# Altium footprint library RPSLib_Connectors.PcbLib: 85 footprints (part 1 of 6)
Each footprint in its own frame and in the unit in brackets; x right, y up, seen from the top. Pads: shape width x height; smd on the part's side, far side on the other; paste and mask are expansions set on the pad; w line width, h text height; cw(c..) or ccw(c..) is an arc to the next point about the centre after c.
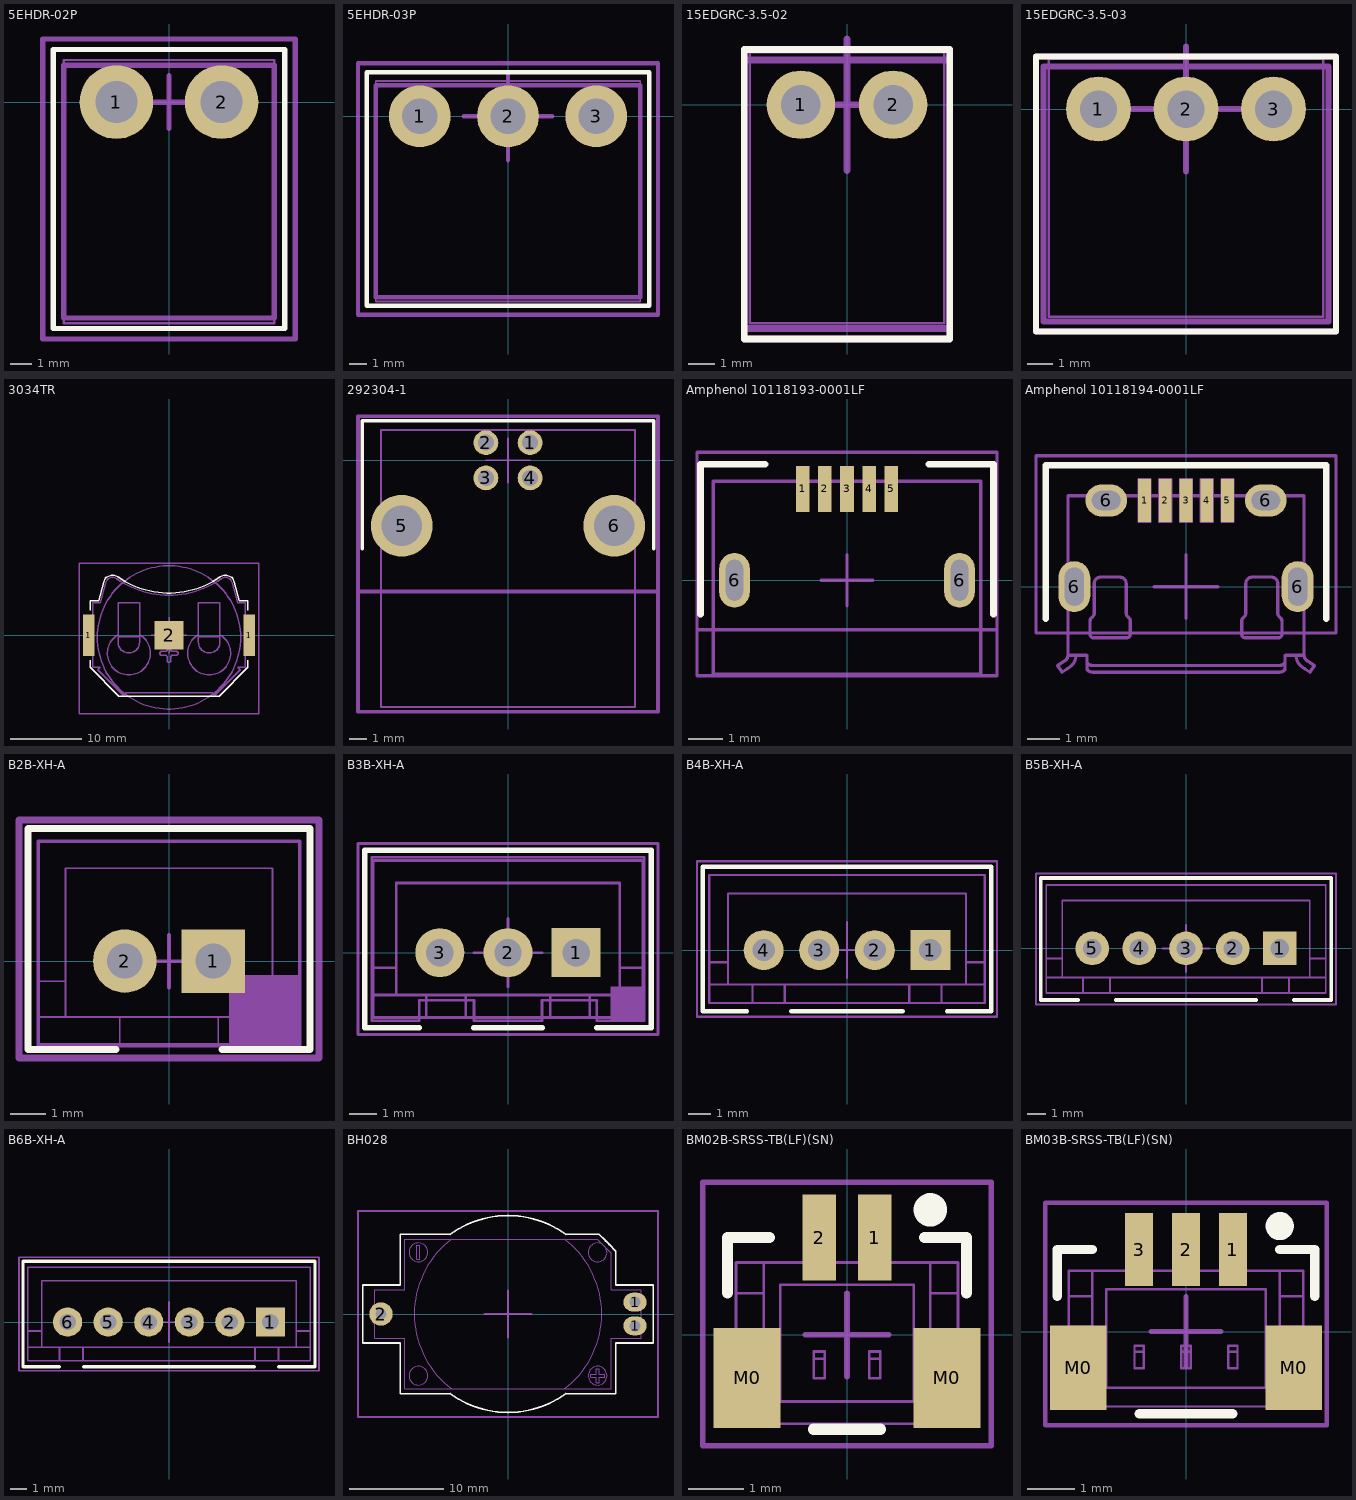
[diagram p0: the footprints below, top view; thin cyan lines are the x and y axes]

## 5EHDR-02P [mm]
pads (2):
  round 3.5 hole 2: 1(-2.5,0) 2(2.5,0)
Top Overlay:
  lines w0.254: -5.5,-10.75 -5.5,2.5 5.5,2.5 5.5,-10.75 -5.5,-10.75
Top Designator:
  lines w0.1: -5,-10.5 -5,2 5,2 5,-10.5 -5,-10.5
  text ".Designator" at -2.868,-0.271 h1.2
Top Courtyard:
  lines w0.254: -1.25,0 1.25,0 ; 0,-1.25 0,1.25 ; -6,-11.25 6,-11.25 6,3 -6,3 -6,-11.25
Top 3D Body:
  lines w0.254: -5,-10.25 5,-10.25 5,1.75 -5,1.75 -5,-10.25
3D body "5EHDR-02P.stp": height 8.47, standoff -4, extent -5,-10.25 5,1.75

## 5EHDR-03P [mm]
pads (3):
  round 3.5 hole 2: 1(-5,0) 2(0,0) 3(5,0)
Top Overlay:
  lines w0.254: -8,-10.75 -8,2.5 8,2.5 8,-10.75 -8,-10.75
Top Designator:
  lines w0.1: -7.5,-10.5 7.5,-10.5 7.5,2 -7.5,2 -7.5,-10.5
  text ".Designator" at -2.868,-0.271 h1.2
Top Courtyard:
  lines w0.254: -2.5,0 2.5,0 ; 0,-2.5 0,2.5 ; -8.5,-11.25 -8.5,3 8.5,3 8.5,-11.25 -8.5,-11.25
Top 3D Body:
  lines w0.254: -7.5,-10.25 -7.5,1.75 7.5,1.75 7.5,-10.25 -7.5,-10.25
20:
  text ".Designator" at -2.253,-0.226 h1
3D body "5EHDR-03P.stp": height 8.47, standoff -4, extent -7.5,-10.25 7.5,1.75

## 15EDGRC-3.5-02 [mm] "Клеммник разъемный угловой 3.5мм 2pin на плату"
height 7
pads (2):
  round 2.6 hole 1.5: 1(-1.75,0) 2(1.75,0)
Top Overlay:
  lines w0.254: -3.9,-8.9 3.9,-8.9 3.9,2.1 -3.9,2.1 -3.9,-8.9
Top Designator:
  lines w0.1: -3.7,-8.3 -3.7,2 3.7,2 3.7,-8.3 -3.7,-8.3
  text ".Designator" at -2.868,-0.271 h1.2
Top Courtyard:
  lines w0.254: -2.5,0 2.5,0 ; 0,-2.5 0,2.5 ; -3.9,-8.9 3.9,-8.9 3.9,2.1 -3.9,2.1 -3.9,-8.9
Top 3D Body:
  lines w0.254: -3.9,-8.5 3.9,-8.5 3.9,1.7 -3.9,1.7 -3.9,-8.5
20:
  text ".Designator" at -2.253,-0.226 h1
3D body "15EDGRC-3.5-02P-14--3DModel-STEP-510211.STEP": height 7.24, standoff -3.4, extent -4,-8.1 3.8,1.1

## 15EDGRC-3.5-03 [mm] "Клеммник разъемный угловой 3.5мм 3pin на плату"
height 7
pads (3):
  round 2.6 hole 1.5: 1(-3.5,0) 2(0,0) 3(3.5,0)
Top Overlay:
  lines w0.254: -6,-8.9 -6,2.1 6,2.1 6,-8.9 -6,-8.9
Top Designator:
  lines w0.1: -5.5,-8.3 5.5,-8.3 5.5,2 -5.5,2 -5.5,-8.3
  text ".Designator" at -2.868,-0.271 h1.2
Top Courtyard:
  lines w0.254: -2.5,0 2.5,0 ; 0,-2.5 0,2.5 ; -6,-8.9 -6,2.1 6,2.1 6,-8.9 -6,-8.9
Top 3D Body:
  lines w0.254: -5.7,-8.5 -5.7,1.7 5.7,1.7 5.7,-8.5 -5.7,-8.5
20:
  text ".Designator" at -2.253,-0.226 h1
3D body "15EDGRC-3.5-03P-14--3DModel-STEP-510211.STEP": height 7.24, standoff -3.4, extent -5.65,-8 5.65,1.2

## 3034TR [mm] "3034TR Battery Holder"
height 4.06
pads (3):
  rect 1.6x5.8 smd mask+0.07: 1(-11.2,0) 1(11.2,0)
  rect 4x4 smd mask+0.07: 2(0,0)
Top Overlay:
  lines w0.2: -11,-3.5 -11,-4.5 -7,-8.5 7,-8.5 11,-4.5 11,-3.5 ; -11,3.5 -11,4.8 -10.905,4.8 -10.105,4.8 -9.834,4.8 -9.127,7.401 cw(c-7.872,7.06) -7.122,8.122 ccw(c0,18.205) 7.122,8.122 cw(c7.872,7.06) 9.127,7.401 9.834,4.8 10.105,4.8 11,4.8 11,3.5
Top Designator:
  text ".Designator" at -2.868,-0.271 h1.2
Top Courtyard:
  circle w0.2: c0,-0.316 r10
  lines w0.2: -2.5,0 2.5,0 ; 0,-2.5 0,2.5 ; -12.5,-11 12.5,-11 12.5,10 -12.5,10 -12.5,-11
Top 3D Body:
  lines w0.2: -10.605,-2.54 -10.855,-2.54 -11.625,-2.54 -11.625,-0.51 -10.855,-0.51 -10.605,-0.51 ; -10.605,0.51 -10.855,0.51 -11.625,0.51 -11.625,2.54 -10.855,2.54 -10.605,2.54 ; 10.605,-2.54 10.855,-2.54 11.625,-2.54 11.625,-0.51 10.855,-0.51 10.605,-0.51 ; 10.605,0.51 10.855,0.51 11.625,0.51 11.625,2.54 10.855,2.54 10.605,2.54 ; -7.105,-0.243 -4.105,-0.243 ; -7.105,-0.243 -7.105,-0.349 -7.105,-0.981 ccw(c-5.605,-0.981) -4.105,-0.981 -4.105,-0.349 -4.105,-0.243 ; -7.105,-0.243 -7.105,0.058 ; -7.105,0.058 ccw(c-5.605,-2.54) -4.105,0.058 ; -7.105,0.058 -7.105,4.5 -4.105,4.5 -4.105,0.058 ; -4.105,-0.243 -4.105,0.058 ; 4.105,-0.243 7.105,-0.243 ; 4.105,-0.243 4.105,-0.349 4.105,-0.981 ccw(c5.605,-0.981) 7.105,-0.981 7.105,-0.349 7.105,-0.243 ; 4.105,-0.243 4.105,0.058 ; 4.105,0.058 ccw(c5.605,-2.54) 7.105,0.058 ; 4.105,0.058 4.105,4.5 7.105,4.5 7.105,0.058 ; 7.105,-0.243 7.105,0.058 ; -10.605,-4.5 -10.105,-4.5 -9.605,-4.5 -9.959,-4.854 -6.399,-8.414 -6.045,-8.06 6.045,-8.06 6.399,-8.414 9.959,-4.854 9.605,-4.5 10.105,-4.5 10.605,-4.5 10.605,4.5 10.105,4.5 9.605,4.5 8.837,7.322 ccw(c7.872,7.06) 7.295,7.877 cw(c0,18.205) -7.295,7.877 ccw(c-7.872,7.06) -8.837,7.322 -9.605,4.5 -10.105,4.5 -10.605,4.5 -10.605,-4.5 ; -1.268,-2.59 ccw(c-1.05,-2.59) -1.05,-2.808 -0.48,-2.808 cw(c-0.48,-3.02) -0.268,-3.02 -0.268,-3.59 ccw(c-0.05,-3.59) -0.05,-3.808 0.05,-3.808 ccw(c0.05,-3.59) 0.268,-3.59 0.268,-3.02 cw(c0.48,-3.02) 0.48,-2.808 1.05,-2.808 ccw(c1.05,-2.59) 1.268,-2.59 1.268,-2.49 ccw(c1.05,-2.49) 1.05,-2.272 0.48,-2.272 cw(c0.48,-2.06) 0.268,-2.06 0.268,-1.49 ccw(c0.05,-1.49) 0.05,-1.272 -0.05,-1.272 ccw(c-0.05,-1.49) -0.268,-1.49 -0.268,-2.06 cw(c-0.48,-2.06) -0.48,-2.272 -1.05,-2.272 ccw(c-1.05,-2.49) -1.268,-2.49 -1.268,-2.59
3D body "3034TR.stp": height 4.06, standoff 0, extent -11.625,-8.413 11.625,8.058

## 292304-1 [mm] "USB-B TE 292304-1"
height 11
pads (6):
  round 1.4 hole 0.9 mask+0.07: 1(1.25,1) 2(-1.25,1) 3(-1.25,-1) 4(1.25,-1)
  round 3.5 hole 2.3 mask+0.07: 5(-6.02,-3.71) 6(6.02,-3.71)
Top Overlay:
  lines w0.2: -8.25,-5 -8.25,2.25 8.25,2.25 8.25,-5
Top Designator:
  text ".Designator" at -2.868,-0.271 h1.2
Top Courtyard:
  lines w0.1: -1.25,0 1.25,0 ; 0,-1.25 0,1.25
  lines w0.2: -8.5,-7.434 8.5,-7.434 ; -8.5,-14.25 -8.5,2.5 8.5,2.5 8.5,-14.25 -8.5,-14.25
Top 3D Body:
  lines w0.1: -7.195,-13.98 7.194,-13.98 7.194,1.72 -7.195,1.72 -7.195,-13.98
3D body "292304-1 norm.stp": height 11.49, standoff -3.93, extent -7.195,-13.98 7.194,1.72

## Amphenol 10118193-0001LF [mm] "USB Micro-B"
height 3
pads (7):
  rect 0.4x1.35 smd mask+0.07: 1(-1.3,2.675) 2(-0.65,2.675) 3(0,2.675) 4(0.65,2.675) 5(1.3,2.675)
  oval 0.9x1.6 hole 0.5 slot 1.2 at 90 deg mask+0.07: 6(-3.3,0) 6(3.3,0)
Top Overlay:
  lines w0.2: -4.3,-1 -4.3,3.4 -2.4,3.4 ; 2.4,3.4 4.3,3.4 4.3,-1
Top Designator:
  text ".Designator" at -2.868,-0.271 h1.2
Top Courtyard:
  lines w0.1: -4.4,-1.45 4.4,-1.45 ; -0.75,0 0.75,0 ; 0,-0.75 0,0.75 ; -4.4,-2.8 4.4,-2.8 4.4,3.75 -4.4,3.75 -4.4,-2.8
Top 3D Body:
  lines w0.1: -3.928,-2.761 -3.928,2.9 3.928,2.9 3.928,-2.761 -3.928,-2.761
3D body "10118193-0001lfc.stp": height 2.86, standoff -0.74, extent -3.928,-2.761 3.928,2.9

## Amphenol 10118194-0001LF [mm]
height 2.35
pads (9):
  rect 0.4x1.35 smd mask+0.07: 1(-1.3,2.7) 2(-0.65,2.7) 3(0,2.7) 4(0.65,2.7) 5(1.3,2.7)
  oval 1x1.6 hole 0.6 slot 1.2 at 90 deg mask+0.07: 6(-3.5,0) 6(3.5,0)
  oval 1.3x1 hole 0.6 slot 0.9 at 0 deg mask+0.07: 6(-2.5,2.7) 6(2.5,2.7)
Top Overlay:
  lines w0.2: -4.4,-1 -4.4,3.8 4.4,3.8 4.4,-1
Top Designator:
  text ".Designator" at -2.868,-0.271 h1.2
Top Courtyard:
  lines w0.1: -1,0 1,0 ; 0,-1 0,1 ; -4.7,-1.45 -4.7,4.1 4.7,4.1 4.7,-1.45 -4.7,-1.45
Top 3D Body:
  drawing of 514 lines, arcs and shapes, not listed
21:
  lines w0.05: -3.8,-0.3 ccw(c-3.5,-0.3) -3.5,-0.6 ccw(c-3.5,-0.3) -3.2,-0.3 ; -3.8,-0.3 -3.2,0.3 ; -3.8,-0.3 -3.8,0.3 ; -3.8,0.3 cw(c-3.5,0.3) -3.5,0.6 cw(c-3.5,0.3) -3.2,0.3 ; -3.8,0.3 -3.2,-0.3 ; -3.2,-0.3 -3.2,0.3 ; -2.65,2.4 cw(c-2.65,2.7) -2.95,2.7 cw(c-2.65,2.7) -2.65,3 ; -2.65,2.4 -2.35,3 ; -2.65,2.4 -2.35,2.4 ; -2.65,3 -2.35,2.4 ; -2.65,3 -2.35,3 ; -2.35,2.4 ccw(c-2.35,2.7) -2.05,2.7 ccw(c-2.35,2.7) -2.35,3 ; -1.5,2.025 -1.1,3.375 ; -1.5,2.025 -1.5,3.375 ; -1.5,2.025 -1.1,2.025 ; -1.5,3.375 -1.1,2.025 ; -1.5,3.375 -1.1,3.375 ; -1.1,2.025 -1.1,3.375 ; -0.85,2.025 -0.45,3.375 ; -0.85,2.025 -0.85,3.375 ; -0.85,2.025 -0.45,2.025 ; -0.85,3.375 -0.45,2.025 ; -0.85,3.375 -0.45,3.375 ; -0.45,2.025 -0.45,3.375 ; -0.2,2.025 0.2,3.375 ; -0.2,2.025 -0.2,3.375 ; -0.2,2.025 0.2,2.025 ; -0.2,3.375 0.2,2.025 ; -0.2,3.375 0.2,3.375 ; 0.2,2.025 0.2,3.375 ; 0.45,2.025 0.85,3.375 ; 0.45,2.025 0.45,3.375 ; 0.45,2.025 0.85,2.025 ; 0.45,3.375 0.85,2.025 ; 0.45,3.375 0.85,3.375 ; 0.85,2.025 0.85,3.375 ; 1.1,2.025 1.5,3.375 ; 1.1,2.025 1.1,3.375 ; 1.1,2.025 1.5,2.025 ; 1.1,3.375 1.5,2.025 ; 1.1,3.375 1.5,3.375 ; 1.5,2.025 1.5,3.375 ; 2.35,2.4 cw(c2.35,2.7) 2.05,2.7 cw(c2.35,2.7) 2.35,3 ; 2.35,2.4 2.65,3 ; 2.35,2.4 2.65,2.4 ; 2.35,3 2.65,2.4 ; 2.35,3 2.65,3 ; 2.65,2.4 ccw(c2.65,2.7) 2.95,2.7 ccw(c2.65,2.7) 2.65,3 ; 3.2,-0.3 ccw(c3.5,-0.3) 3.5,-0.6 ccw(c3.5,-0.3) 3.8,-0.3 ; 3.2,-0.3 3.8,0.3 ; 3.2,-0.3 3.2,0.3 ; 3.2,0.3 cw(c3.5,0.3) 3.5,0.6 cw(c3.5,0.3) 3.8,0.3 ; 3.2,0.3 3.8,-0.3 ; 3.8,-0.3 3.8,0.3
3D body "10118194-0001LF.stp": height 2.77, standoff -0.5, extent -4.025,-2.68 4.025,2.9

## B2B-XH-A [mm] "2 pin connector"
height 7
pads (2):
  rect 1.8x1.8 hole 1 mask+0.07: 1(1.25,0)
  round 1.8 hole 1 mask+0.07: 2(-1.25,0)
Top Overlay:
  lines w0.2: -1.5,-2.5 -4,-2.5 -4,3.75 4,3.75 4,-2.5 1.5,-2.5
Top Designator:
  rectangle: 1.7,-2.4 3.7,-0.4
  lines w0.1: -3.7,-2.4 -3.7,3.4 3.7,3.4 3.7,-2.4 -3.7,-2.4
  text ".Designator" at -2.868,-0.271 h1.2
Top Courtyard:
  lines w0.1: -0.75,0 0.75,0 ; 0,-0.75 0,0.75
  lines w0.2: -4.25,-2.75 -4.25,4 4.25,4 4.25,-2.75 -4.25,-2.75
Top 3D Body:
  lines w0.05: -1.753,-2.349 1.753,-2.349 ; -1.753,-1.587 1.753,-1.587 ; -3.696,-1.587 -1.894,-1.587 -1.397,-1.587 -1.397,-2.349 -1.894,-2.349 -3.696,-2.349 -3.696,-1.587 ; -3.696,-1.587 -3.696,-0.572 ; -3.696,-1.587 -2.934,-1.587 -2.934,-0.572 ; -3.696,-0.572 -3.696,3.391 3.696,3.391 3.696,-0.572 ; -3.696,-0.572 -2.934,-0.572 ; -3.696,-0.572 -2.934,-0.572 ; -2.934,-0.572 -2.934,2.629 2.934,2.629 2.934,-0.572 ; 2.934,-0.572 3.696,-0.572 ; 2.934,-0.572 2.934,-1.587 3.696,-1.587 ; 2.934,-0.572 3.696,-0.572 ; 3.696,-1.587 1.894,-1.587 1.397,-1.587 1.397,-2.349 1.894,-2.349 3.696,-2.349 3.696,-1.587 ; 3.696,-1.587 3.696,-0.572
20:
  text ".Designator" at -1.126,-0.113 h0.5
3D body "B2B-XH-A.stp": height 7.11, standoff -3.81, extent -3.696,-2.349 3.696,3.391

## B3B-XH-A [mm] "JST 3 pin connector XH"
height 7
pads (3):
  rect 1.8x1.8 hole 1 mask+0.07: 1(2.5,0)
  round 1.8 hole 1 mask+0.07: 2(0,0) 3(-2.5,0)
Top Overlay:
  lines w0.2: -3.25,-2.75 -5.25,-2.75 -5.25,3.75 5.25,3.75 5.25,-2.75 3.25,-2.75 ; -1.25,-2.75 1.25,-2.75
Top Designator:
  rectangle: 3.75,-2.5 5,-1.25
  lines w0.1: -5,-2.5 -3.25,-2.5 -3.25,-1.75 -1.25,-1.75 -1.25,-2.5 1.25,-2.5 1.25,-1.75 3.25,-1.75 3.25,-2.5 5,-2.5 5,3.5 -5,3.5 -5,-2.5
  text ".Designator" at -2.868,-0.271 h1.2
Top Courtyard:
  lines w0.1: -1.25,0 1.25,0 ; 0,-1.25 0,1.25 ; -5.5,-3 -5.5,4 5.5,4 5.5,-3 -5.5,-3
Top 3D Body:
  lines w0.1: -4.1,-1.55 -4.1,-0.55 ; 4.1,-1.55 4.1,-0.55 ; -4.95,-1.55 -3,-1.55 ; -4.95,-1.55 -4.95,-2.375 -3,-2.375 ; -4.95,-1.55 -4.95,-0.55 ; -4.95,-0.55 -4.1,-0.55 ; -4.95,-0.55 -4.95,3.375 4.95,3.375 4.95,-0.55 ; -4.1,-0.55 -4.1,2.55 4.1,2.55 4.1,-0.55 ; -3,-2.375 -1.55,-2.375 ; -3,-2.375 -3,-1.55 ; -3,-1.55 -1.55,-1.55 ; -1.55,-2.375 1.55,-2.375 ; -1.55,-2.375 -1.55,-1.55 ; -1.55,-1.55 1.55,-1.55 ; 1.55,-2.375 3,-2.375 ; 1.55,-2.375 1.55,-1.55 ; 1.55,-1.55 3,-1.55 ; 3,-2.375 4.95,-2.375 4.95,-1.55 ; 3,-2.375 3,-1.55 ; 3,-1.55 4.95,-1.55 ; 4.1,-0.55 4.95,-0.55 ; 4.95,-1.55 4.95,-0.55
20:
  text ".Designator" at -1.126,-0.113 h0.5
3D body "B3B-XH-A.stp": height 7, standoff -3.4, extent -4.95,-2.375 4.95,3.375

## B4B-XH-A [mm] "JST 4 pin connector"
height 7
pads (4):
  rect 1.8x1.8 hole 1 mask+0.07: 1(3.75,0)
  round 1.8 hole 1 mask+0.07: 2(1.25,0) 3(-1.25,0) 4(-3.75,0)
Top Overlay:
  lines w0.2: -4.5,-2.75 -6.5,-2.75 -6.5,3.75 6.5,3.75 6.5,-2.75 4.5,-2.75 ; -2.5,-2.75 2.5,-2.75
Top Designator:
  text ".Designator" at -2.868,-0.271 h1.2
Top Courtyard:
  lines w0.1: -1.25,0 1.25,0 ; 0,-1.25 0,1.25 ; -6.75,-3 -6.75,4 6.75,4 6.75,-3 -6.75,-3
Top 3D Body:
  lines w0.1: -5.35,-1.55 -5.35,-0.55 ; 5.35,-1.55 5.35,-0.55 ; -6.2,-1.55 -4.25,-1.55 ; -6.2,-1.55 -6.2,-2.375 -4.25,-2.375 ; -6.2,-1.55 -6.2,-0.55 ; -6.2,-0.55 -5.35,-0.55 ; -6.2,-0.55 -6.2,3.375 6.2,3.375 6.2,-0.55 ; -5.35,-0.55 -5.35,2.55 5.35,2.55 5.35,-0.55 ; -4.25,-2.375 -2.8,-2.375 ; -4.25,-2.375 -4.25,-1.55 ; -4.25,-1.55 -2.8,-1.55 ; -2.8,-2.375 2.8,-2.375 ; -2.8,-2.375 -2.8,-1.55 ; -2.8,-1.55 2.8,-1.55 ; 2.8,-2.375 4.25,-2.375 ; 2.8,-2.375 2.8,-1.55 ; 2.8,-1.55 4.25,-1.55 ; 4.25,-2.375 6.2,-2.375 6.2,-1.55 ; 4.25,-2.375 4.25,-1.55 ; 4.25,-1.55 6.2,-1.55 ; 5.35,-0.55 6.2,-0.55 ; 6.2,-1.55 6.2,-0.55 ; -4.07,-0.32 -4.07,0.32 -3.43,0.32 -3.43,-0.32 -4.07,-0.32 ; -1.57,-0.32 -1.57,0.32 -0.93,0.32 -0.93,-0.32 -1.57,-0.32 ; 0.93,-0.32 0.93,0.32 1.57,0.32 1.57,-0.32 0.93,-0.32 ; 3.43,-0.32 4.07,-0.32 4.07,0.32 3.43,0.32 3.43,-0.32
3D body "B4B-XH-A.stp": height 7, standoff -3.4, extent -6.2,-2.375 6.2,3.375

## B5B-XH-A [mm] "JST 5 pin connector XH"
height 7
pads (5):
  rect 1.8x1.8 hole 1 mask+0.07: 1(5,0)
  round 1.8 hole 1 mask+0.07: 2(2.5,0) 3(0,0) 4(-2.5,0) 5(-5,0)
Top Overlay:
  lines w0.2: -5.75,-2.75 -7.75,-2.75 -7.75,3.75 7.75,3.75 7.75,-2.75 5.75,-2.75 ; -3.75,-2.75 3.75,-2.75
Top Designator:
  text ".Designator" at -2.868,-0.271 h1.2
Top Courtyard:
  lines w0.1: -1.25,0 1.25,0 ; 0,-1.25 0,1.25 ; -8,-3 -8,4 8,4 8,-3 -8,-3
Top 3D Body:
  lines w0.1: -6.6,-1.55 -6.6,-0.55 ; 6.6,-1.55 6.6,-0.55 ; -7.45,-1.55 -7.45,-0.55 ; -7.45,-1.55 -7.45,-2.375 -5.5,-2.375 ; -7.45,-1.55 -5.5,-1.55 ; -7.45,-0.55 -6.6,-0.55 ; -7.45,-0.55 -7.45,3.375 7.45,3.375 7.45,-0.55 ; -6.6,-0.55 -6.6,2.55 6.6,2.55 6.6,-0.55 ; -5.5,-2.375 -5.5,-1.55 ; -5.5,-2.375 -4.05,-2.375 ; -5.5,-1.55 -4.05,-1.55 ; -4.05,-2.375 -4.05,-1.55 ; -4.05,-2.375 4.05,-2.375 ; -4.05,-1.55 4.05,-1.55 ; 4.05,-2.375 5.5,-2.375 ; 4.05,-2.375 4.05,-1.55 ; 4.05,-1.55 5.5,-1.55 ; 5.5,-2.375 5.5,-1.55 ; 5.5,-2.375 7.45,-2.375 7.45,-1.55 ; 5.5,-1.55 7.45,-1.55 ; 6.6,-0.55 7.45,-0.55 ; 7.45,-1.55 7.45,-0.55
3D body "B5B-XH-A.stp": height 7, standoff -3.4, extent -7.45,-2.375 7.45,3.375

## B6B-XH-A [mm] "JST 6 pin connector"
height 7
pads (6):
  rect 1.8x1.8 hole 1 mask+0.07: 1(6.25,0)
  round 1.8 hole 1 mask+0.07: 2(3.75,0) 3(1.25,0) 4(-1.25,0) 5(-3.75,0) 6(-6.25,0)
Top Overlay:
  lines w0.2: -6.75,-2.75 -9,-2.75 -9,3.75 9,3.75 9,-2.75 6.75,-2.75 ; -5.25,-2.75 5.25,-2.75
Top Designator:
  text ".Designator" at -2.868,-0.271 h1.2
Top Courtyard:
  lines w0.1: -1.25,0 1.25,0 ; 0,-1.25 0,1.25 ; -9.25,-3 -9.25,4 9.25,4 9.25,-3 -9.25,-3
Top 3D Body:
  lines w0.1: -7.85,-1.55 -7.85,-0.55 ; 7.85,-1.55 7.85,-0.55 ; -8.7,-1.55 -8.7,-0.55 ; -8.7,-1.55 -8.7,-2.375 -6.75,-2.375 ; -8.7,-1.55 -6.75,-1.55 ; -8.7,-0.55 -8.7,3.375 8.7,3.375 8.7,-0.55 ; -8.7,-0.55 -7.85,-0.55 ; -7.85,-0.55 -7.85,2.55 7.85,2.55 7.85,-0.55 ; -6.75,-2.375 -6.75,-1.55 ; -6.75,-2.375 -5.3,-2.375 ; -6.75,-1.55 -5.3,-1.55 ; -5.3,-2.375 -5.3,-1.55 ; -5.3,-2.375 5.3,-2.375 ; -5.3,-1.55 5.3,-1.55 ; 5.3,-2.375 5.3,-1.55 ; 5.3,-2.375 6.75,-2.375 ; 5.3,-1.55 6.75,-1.55 ; 6.75,-2.375 6.75,-1.55 ; 6.75,-2.375 8.7,-2.375 8.7,-1.55 ; 6.75,-1.55 8.7,-1.55 ; 7.85,-0.55 8.7,-0.55 ; 8.7,-1.55 8.7,-0.55
3D body "B6B-XH-A.stp": height 7, standoff -3.4, extent -8.7,-2.375 8.7,3.375

## BH028 [mm] "Держатель батареи"
height 5.5
pads (3):
  oval 2.5x2 hole 1.2 mask+0.07: 1(13.55,-1.27) 1(13.55,1.27)
  round 2.5 hole 1.2 mask+0.07: 2(-13.55,0)
Top Overlay:
  lines w0.2: -15.5,-3.1 -15.5,3.1 -11.5,3.1 -11.5,8.5 -6.164,8.5 cw(c0,0) 6.164,8.5 9.707,8.5 10.404,7.803 10.789,7.418 11.5,6.707 11.5,3.1 15.5,3.1 15.5,-3.1 11.5,-3.1 11.5,-8.5 6.164,-8.5 cw(c0,0) -6.164,-8.5 -11.5,-8.5 -11.5,-3.1 -15.5,-3.1
Top Designator:
  text ".Designator" at -2.868,-0.271 h1.2
Top Courtyard:
  lines w0.2: -2.5,0 2.5,0 ; 0,-2.5 0,2.5 ; -16,-11 -16,11 16,11 16,-11 -16,-11
Top 3D Body:
  circle w0.1: c9.562,-6.577 r1
  circle w0.1: c-9.562,-6.577 r1
  circle w0.1: c-9.562,6.577 r1
  lines w0.1: -6,-8 cw(c0,0) -6,8 ; -6,-8 -11,-8 -11,-2.6 -14.2,-2.6 -14.2,2.6 -11,2.6 -11,8 -6,8 ; -6,-8 6,-8 ; -6,8 6,8 ; 6,-8 ccw(c0,0) 6,8 ; 6,-8 11,-8 11,-2.6 14.2,-2.6 14.2,2.6 11,2.6 11,6.5 10.435,7.065 ; 6,8 9.5,8 10.051,7.449 ; 10.051,7.449 ccw(c9.562,6.577) 10.435,7.065 ; 10.051,7.449 10.435,7.065 ; -9.712,5.827 -9.412,5.827 -9.412,7.327 -9.712,7.327 -9.712,5.827 ; 8.812,-6.727 9.412,-6.727 9.412,-7.327 9.712,-7.327 9.712,-6.727 10.312,-6.727 10.312,-6.427 9.712,-6.427 9.712,-5.827 9.412,-5.827 9.412,-6.427 8.812,-6.427 8.812,-6.727
3D body "BH028.stp": height 5.5, standoff -2, extent -14.2,-8 14.2,8

## BM02B-SRSS-TB(LF)(SN) [mm] "JST 1.0 mm pitch connector"
height 5
pads (4):
  rect 0.6x1.55 smd mask+0.07: 1(0.5,1.75) 2(-0.5,1.75)
  rect 1.2x1.8 smd mask+0.07: M0(-1.8,-0.775) M0(1.8,-0.775)
Top Overlay:
  circle w0.4: c1.5,2.25 r0.1
  lines w0.2: -2.15,0.75 -2.15,1.75 -1.4,1.75 ; -0.6,-1.7 0.6,-1.7 ; 1.4,1.75 2.15,1.75 2.15,0.75
Top Designator:
  text ".Designator" at -2.868,-0.271 h1.2
Top Courtyard:
  lines w0.1: -0.75,0 0.75,0 ; 0,-0.75 0,0.75 ; -2.6,-2 -2.6,2.75 2.6,2.75 2.6,-2 -2.6,-2
Top 3D Body:
  lines w0.05: -1.5,0.75 -2,0.75 ; -0.6,1.3 -0.6,2 -0.4,2 -0.4,1.3 ; 0.4,1.3 0.4,2 0.6,2 0.6,1.3 ; 1.5,0.75 2,0.75 ; -2,0.1 -2,0.75 ; -2,0.1 -1.5,0.1 -1.5,1.3 ; -2,0.1 -2,-1.6 2,-1.6 2,0.1 ; -2,0.75 -2,1.3 -1.5,1.3 ; -1.5,1.3 1.5,1.3 ; -1.2,-0.7 -1.2,-1.2 1.2,-1.2 1.2,-0.7 ; -1.2,-0.7 -1.55,-0.7 -1.55,-0.1 -1.2,-0.1 ; -1.2,-0.7 -1.2,-0.1 ; -1.2,-0.1 -1.2,0.9 1.2,0.9 1.2,-0.1 ; -0.6,-0.43 -0.4,-0.43 ; -0.6,-0.43 -0.6,-0.78 -0.4,-0.78 -0.4,-0.43 ; -0.6,-0.43 -0.6,-0.3 -0.4,-0.3 -0.4,-0.43 ; 0.4,-0.43 0.4,-0.78 0.6,-0.78 0.6,-0.43 ; 0.4,-0.43 0.4,-0.3 0.6,-0.3 0.6,-0.43 ; 0.4,-0.43 0.6,-0.43 ; 1.2,-0.7 1.55,-0.7 1.55,-0.1 1.2,-0.1 ; 1.2,-0.7 1.2,-0.1 ; 1.5,1.3 1.5,0.1 2,0.1 ; 1.5,1.3 2,1.3 2,0.75 ; 2,0.1 2,0.75
3D body "BM02B-SRSS-TB.STEP": height 4.35, standoff 0.03, extent -2,-1.6 2,2

## BM03B-SRSS-TB(LF)(SN) [mm] "JST 1.0 mm pitch connector"
height 5
pads (5):
  rect 0.6x1.55 smd mask+0.07: 1(1,1.75) 2(0,1.75) 3(-1,1.75)
  rect 1.2x1.8 smd mask+0.07: M0(-2.3,-0.775) M0(2.3,-0.775)
Top Overlay:
  circle w0.4: c2,2.25 r0.1
  lines w0.2: -2.75,0.75 -2.75,1.75 -2,1.75 ; -1,-1.75 1,-1.75 ; 2,1.75 2.75,1.75 2.75,0.75
Top Designator:
  text ".Designator" at -2.868,-0.271 h1.2
Top Courtyard:
  lines w0.1: -0.75,0 0.75,0 ; 0,-0.75 0,0.75 ; -3,-2 -3,2.75 3,2.75 3,-2 -3,-2
Top 3D Body:
  lines w0.05: -2,0.75 -2.5,0.75 ; -1.1,1.3 -1.1,2 -0.9,2 -0.9,1.3 ; -0.1,1.3 -0.1,2 0.1,2 0.1,1.3 ; 0.9,1.3 0.9,2 1.1,2 1.1,1.3 ; 2,0.75 2.5,0.75 ; -2.5,0.1 -2,0.1 -2,1.3 ; -2.5,0.1 -2.5,-1.6 2.5,-1.6 2.5,0.1 ; -2.5,0.1 -2.5,0.75 ; -2.5,0.75 -2.5,1.3 -2,1.3 ; -2,1.3 2,1.3 ; -1.7,-0.7 -2.05,-0.7 -2.05,-0.1 -1.7,-0.1 ; -1.7,-0.7 -1.7,-0.1 ; -1.7,-0.7 -1.7,-1.2 1.7,-1.2 1.7,-0.7 ; -1.7,-0.1 -1.7,0.9 1.7,0.9 1.7,-0.1 ; -1.1,-0.43 -1.1,-0.3 -0.9,-0.3 -0.9,-0.43 ; -1.1,-0.43 -0.9,-0.43 ; -1.1,-0.43 -1.1,-0.78 -0.9,-0.78 -0.9,-0.43 ; -0.1,-0.43 0.1,-0.43 ; -0.1,-0.43 -0.1,-0.78 0.1,-0.78 0.1,-0.43 ; -0.1,-0.43 -0.1,-0.3 0.1,-0.3 0.1,-0.43 ; 0.9,-0.43 1.1,-0.43 ; 0.9,-0.43 0.9,-0.3 1.1,-0.3 1.1,-0.43 ; 0.9,-0.43 0.9,-0.78 1.1,-0.78 1.1,-0.43 ; 1.7,-0.7 2.05,-0.7 2.05,-0.1 1.7,-0.1 ; 1.7,-0.7 1.7,-0.1 ; 2,1.3 2.5,1.3 2.5,0.75 ; 2,1.3 2,0.1 2.5,0.1 ; 2.5,0.1 2.5,0.75
3D body "BM03B-SRSS-TB.STEP": height 4.35, standoff 0.03, extent -2.5,-1.6 2.5,2